# Altium footprint library General_Lib.PcbLib: 729 footprints (part 2 of 46)
Each footprint in its own frame and in the unit in brackets; x right, y up, seen from the top. Pads: shape width x height; smd on the part's side, far side on the other; paste and mask are expansions set on the pad; w line width, h text height; cw(c..) or ccw(c..) is an arc to the next point about the centre after c.
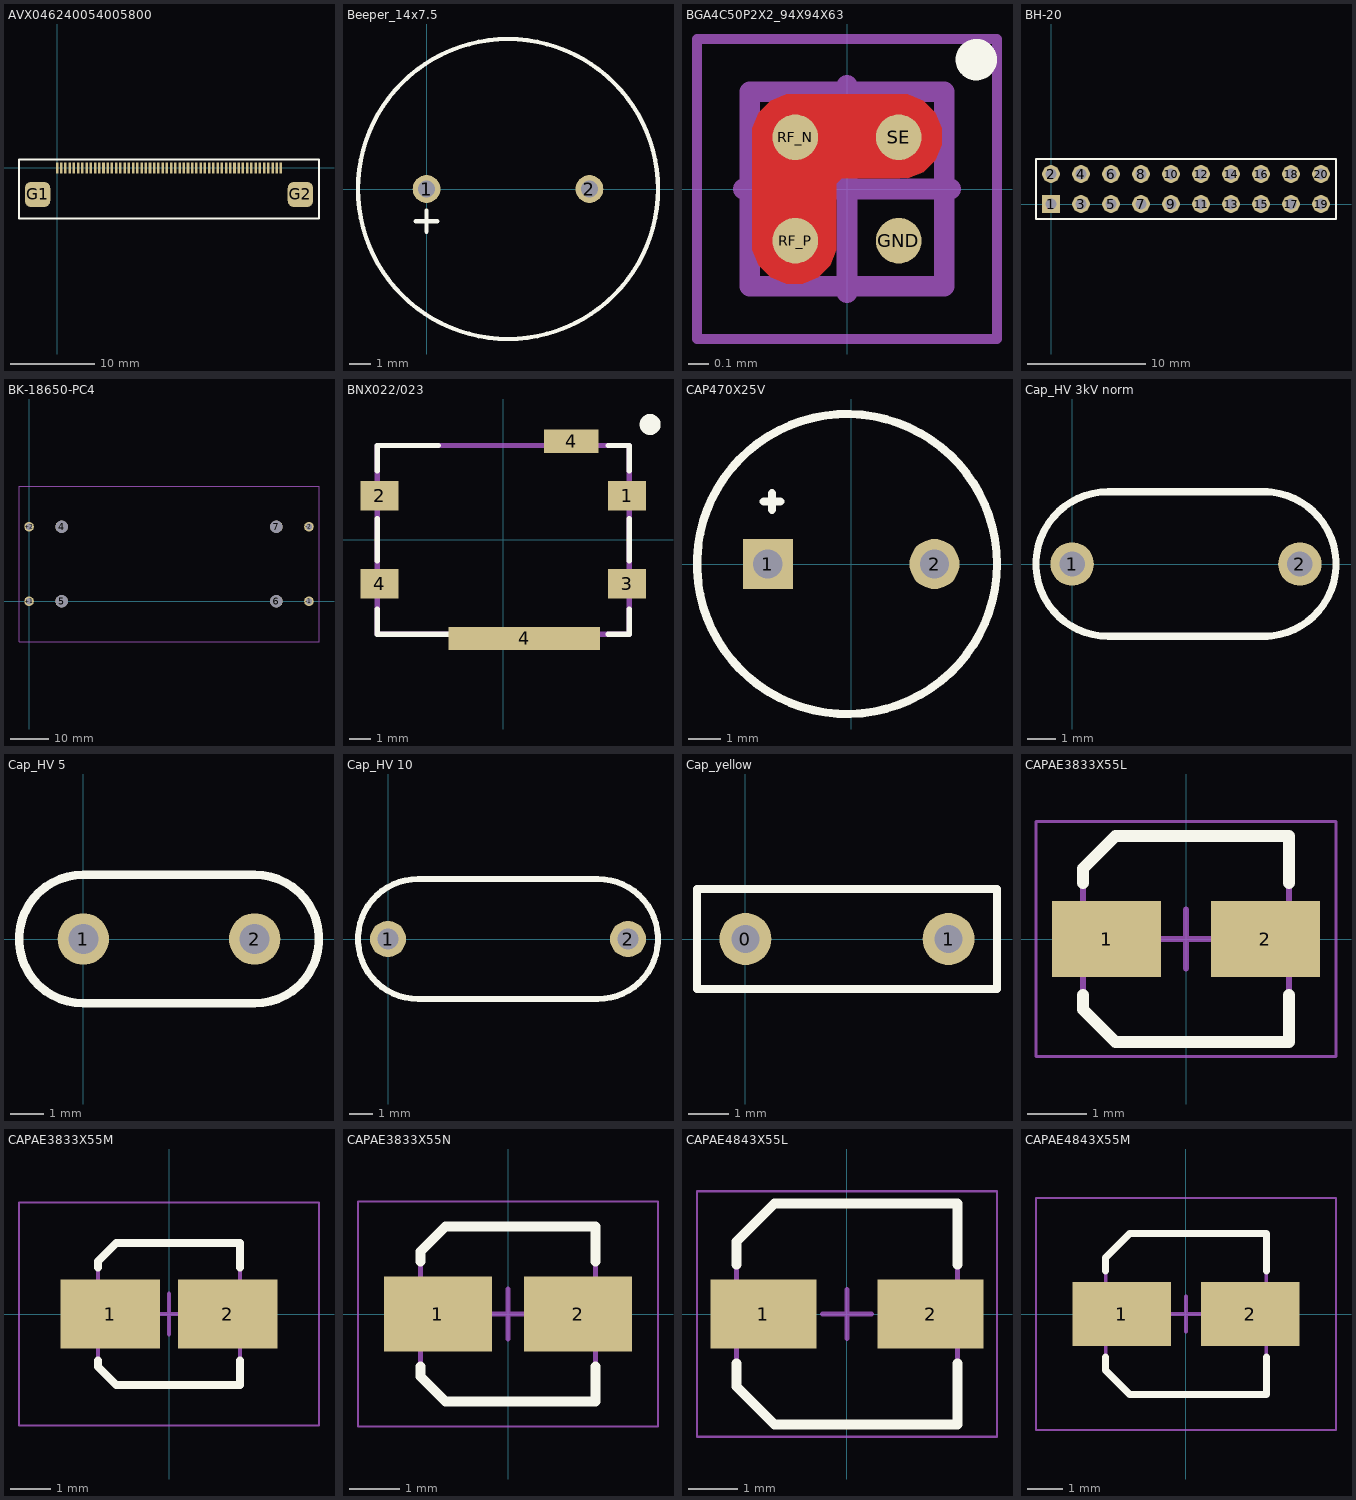
[diagram p1: the footprints below, top view; thin cyan lines are the x and y axes]

## AVX046240054005800 [mm] "0.5mm pitch 54 way connector fot TM035KBH11 TFT display"
height 2
pads (56):
  rect 0.3x1.3 smd: 1(0,0) 2(0.5,0) 3(1,0) 4(1.5,0) 5(2,0) 6(2.5,0) 7(3,0) 8(3.5,0) 9(4,0) 10(4.5,0) 11(5,0) 12(5.5,0) 13(6,0) 14(6.5,0) 15(7,0) 16(7.5,0) 17(8,0) 18(8.5,0) 19(9,0) 20(9.5,0) 21(10,0) 22(10.5,0) 23(11,0) 24(11.5,0) 25(12,0) 26(12.5,0) 27(13,0) 28(13.5,0) 29(14,0) 30(14.5,0) 31(15,0) 32(15.5,0) 33(16,0) 34(16.5,0) 35(17,0) 36(17.5,0) 37(18,0) 38(18.5,0) 39(19,0) 40(19.5,0) 41(20,0) 42(20.5,0) 43(21,0) 44(21.5,0) 45(22,0) 46(22.5,0) 47(23,0) 48(23.5,0) 49(24,0) 50(24.5,0) 51(25,0) 52(25.5,0) 53(26,0) 54(26.5,0)
  rrect50% 3x3 smd: G1(-2.3,-3.15) G2(28.8,-3.15)
Top Overlay:
  lines w0.2: -4.5,-6 -4.5,1 31,1 31,-6 -4.5,-6

## Beeper_14x7.5 [mm]
height 0.001
pads (2):
  round 1.3 hole 0.8: 1(0,0) 2(7.6,0)
Top Overlay:
  circle w0.2: c3.8,0 r7
  lines w0.2: -0.5,-1.5 0.5,-1.5 ; 0,-2 0,-1
3D body "HMP14A.step": height 7.59, standoff -5.5, extent -3.045,-6.845 10.645,6.845

## BGA4C50P2X2_94X94X63 [mm] "BGA, 4-Leads, Body 0.94x0.94mmx0.63mm, Pitch 0.50mm"
height 0.63
pads (4):
  round 0.22 smd mask+0.1: GND(0.25,-0.25) RF_N(-0.25,0.25) RF_P(-0.25,-0.25) SE(0.25,0.25)
Top Layer:
  pour cut-out: -0.254,-0.457 -0.294,-0.457 -0.369,-0.426 -0.426,-0.369 -0.457,-0.294 -0.457,-0.254 -0.457,0.254 -0.457,0.294 -0.426,0.369 -0.369,0.426 -0.294,0.457 -0.254,0.457 0.254,0.457 0.294,0.457 0.369,0.426 0.426,0.369 0.457,0.294 0.457,0.254 0.457,0.214 0.426,0.139 0.369,0.082 0.294,0.051 0.254,0.051 -0.025,0.051 -0.051,0.025 -0.051,-0.254 -0.051,-0.294 -0.082,-0.369 -0.139,-0.426 -0.214,-0.457
Top Overlay:
  circle w0.1: c0.625,0.625 r0.05
Mechanical 13:
  lines w0.1: -0.47,-0.47 0.47,-0.47 0.47,0.47 -0.47,0.47 -0.47,-0.47
Mechanical 15:
  lines w0.05: -0.725,-0.725 0.725,-0.725 0.725,0.725 -0.725,0.725 -0.725,-0.725
  lines w0.1: -0.5,0 0.5,0 ; 0,-0.5 0,0.5
3D body: height 0.63, standoff 0.3, extent -0.47,-0.47 0.47,0.47

## BH-20 [mm] "Connector; Header; 10x2 Position"
height 9
pads (20):
  rect 1.5x1.5 hole 0.9: 1(0,0)
  round 1.5 hole 0.9: 2(0,2.54) 3(2.54,0) 4(2.54,2.54) 5(5.08,0) 6(5.08,2.54) 7(7.62,0) 8(7.62,2.54) 9(10.16,0) 10(10.16,2.54) 11(12.7,0) 12(12.7,2.54) 13(15.24,0) 14(15.24,2.54) 15(17.78,0) 16(17.78,2.54) 17(20.32,0) 18(20.32,2.54) 19(22.86,0) 20(22.86,2.54)
Top Overlay:
  lines w0.2: -1.27,-1.27 0.635,-1.27 24.13,-1.27 24.13,3.81 0.635,3.81 -1.27,3.81 -1.27,-1.27
3D body "BH-20.step": height 8.75, standoff -3.1, extent -5.08,-3.105 27.94,5.995

## BK-18650-PC4 [mm]
pads (8):
  round 3.2 hole 3.2 unplated: 4(8.44,19.3) 5(8.44,0) 6(64.06,0) 7(64.06,19.3)
  round 2.5 hole 1.6: +1(0,0) +2(0,19.3) -1(72.5,0) -2(72.5,19.3)
Mechanical 15:
  lines w0.254: -2.6,-10.45 -2.6,29.75 75.1,29.75 75.1,-10.45 -2.6,-10.45
3D body "18650_holder.STEP": height 2.79, standoff -21.95, extent -2.6,-10.45 75.1,29.76

## BNX022/023 [mm]
pads (6):
  rect 1.8x1.4 smd: 1(5.9,2.1) 2(-5.9,2.1) 3(5.9,-2.1) 4(-5.9,-2.1)
  rect 7.2x1.1 smd: 4(1,-4.7)
  rect 2.6x1.1 smd: 4(3.25,4.7)
Top Overlay:
  circle w0.5: c7,5.5 r0.25
  lines w0.254: -6,-3.3 -6,-4.5 1.5,-4.5 ; -6,-1 -6,1 ; -6,3.3 -6,4.5 -3.1,4.5 ; 5,-4.5 6,-4.5 6,-3.3 ; 5,4.5 6,4.5 6,3.3 ; 6,-1 6,1
Mechanical 13:
  lines w0.254: -6,-4.5 6,-4.5 6,4.5 -6,4.5 -6,-4.5
3D body "User Library-BNX022.step": height 3.1, standoff 0, extent -6.05,-4.55 6.05,4.55

## CAP470X25V [mil]
height 472.44
pads (2):
  rect 60x60 hole 35: 1(-100,0)
  round 60 hole 35: 2(100,0)
Top Overlay:
  circle w10: c-5,0 r180
  lines w10: -105,75 -85,75 ; -95,65 -95,85
3D body "Cap electro 10x12_5x5_0mm.step": height 512.81, standoff -136.91, extent -197.85,-197.85 197.85,197.85

## Cap_HV 3kV norm [mil]
height 433.07
pads (2):
  round 60 hole 35: 1(0,0) 2(314.96,0)
Top Overlay:
  lines w10: 265,-100 ccw(c265,0) 265,100 ; 270,-100 50,-100 cw(c50,0) 50,100 270,100
3D body "CAP 8 HV.stp": height 472.3, standoff -59.06, extent -43.3,-60.04 358.28,58.07

## Cap_HV 5 [mil]
height 275.59
pads (2):
  round 60 hole 35: 1(0,0) 2(200,0)
Top Overlay:
  lines w10: 0,-75 cw(c0,0) 0,75 200,75 cw(c200,0) 200,-75 0,-75
3D body "Kondensator_5mm.step": height 452.76, standoff -42.01, extent -59.06,-49.61 255.91,49.21

## Cap_HV 10 [mil]
height 275.59
pads (2):
  round 60 hole 35: 1(0,0) 2(400,0)
Top Overlay:
  lines w10: 50,-100 cw(c50,0) 50,100 350,100 cw(c350,0) 350,-100 50,-100

## Cap_yellow [mm]
pads (2):
  round 1.3 hole 0.7: 0(0,0) 1(5.08,0)
Top Overlay:
  lines w0.2: -1.21,-1.25 6.29,-1.25 6.29,1.25 -1.21,1.25 -1.21,-1.25
3D body "Cap yellow.stp": height 6.5, standoff -3, extent -1.25,-1.25 6.25,1.25

## CAPAE3833X55L [mm] "Aluminum Electrolytic Capacitor, Body 3,30x3,30x5,50mm, IPC High Density"
height 5.5
pads (2):
  rect 1.85x1.3 smd: 1(-1.35,0) 2(1.35,0)
Top Overlay:
  lines w0.2: -1.75,-0.95 -1.75,-1.2 -1.2,-1.75 1.75,-1.75 1.75,-0.95 ; -1.75,0.95 -1.75,1.2 -1.2,1.75 1.75,1.75 1.75,0.95
Mechanical 13:
  lines w0.1: -1.75,-1.2 -1.75,1.2 -1.2,1.75 1.75,1.75 1.75,-1.75 -1.2,-1.75 -1.75,-1.2
Mechanical 15:
  lines w0.05: -2.55,-2 2.55,-2 2.55,2 -2.55,2 -2.55,-2
  lines w0.1: -0.5,0 0.5,0 ; 0,-0.5 0,0.5
3D body "CAPAE3833X55L.step": height 5.5, standoff 0, extent -1.875,-1.75 1.875,1.75

## CAPAE3833X55M [mm] "Aluminum Electrolytic Capacitor, Body 3,30x3,30x5,50mm, IPC Low Density"
height 5.5
pads (2):
  rect 2.45x1.7 smd: 1(-1.45,0) 2(1.45,0)
Top Overlay:
  lines w0.2: -1.75,-1.15 -1.75,-1.3 -1.3,-1.75 1.75,-1.75 1.75,-1.15 ; -1.75,1.15 -1.75,1.3 -1.3,1.75 1.75,1.75 1.75,1.15
Mechanical 13:
  lines w0.1: -1.75,-1.3 -1.3,-1.75 1.75,-1.75 1.75,1.75 -1.3,1.75 -1.75,1.3 -1.75,-1.3
Mechanical 15:
  lines w0.05: -3.7,-2.75 -3.7,2.75 3.7,2.75 3.7,-2.75 -3.7,-2.75
  lines w0.1: -0.5,0 0.5,0 ; 0,-0.5 0,0.5
3D body "CAPAE3833X55M.step": height 5.5, standoff 0, extent -1.875,-1.75 1.875,1.75

## CAPAE3833X55N [mm] "Aluminum Electrolytic Capacitor, Body 3,30x3,30x5,50mm, IPC Medium Density"
height 5.5
pads (2):
  rect 2.15x1.5 smd: 1(-1.4,0) 2(1.4,0)
Top Overlay:
  lines w0.2: -1.75,-1.05 -1.75,-1.25 -1.25,-1.75 1.75,-1.75 1.75,-1.05 ; -1.75,1.05 -1.75,1.25 -1.25,1.75 1.75,1.75 1.75,1.05
Mechanical 13:
  lines w0.1: -1.75,-1.25 -1.75,1.25 -1.25,1.75 1.75,1.75 1.75,-1.75 -1.25,-1.75 -1.75,-1.25
Mechanical 15:
  lines w0.05: -3,-2.25 3,-2.25 3,2.25 -3,2.25 -3,-2.25
  lines w0.1: -0.5,0 0.5,0 ; 0,-0.5 0,0.5
3D body "CAPAE3833X55N.step": height 5.5, standoff 0, extent -1.875,-1.75 1.875,1.75

## CAPAE4843X55L [mm] "Aluminum Electrolytic Capacitor, Body 4,30x4,30x5,50mm, IPC High Density"
height 5.5
pads (2):
  rect 2.15x1.4 smd: 1(-1.7,0) 2(1.7,0)
Top Overlay:
  lines w0.2: -2.25,-1 -2.25,-1.475 -1.475,-2.25 2.25,-2.25 2.25,-1 ; -2.25,1 -2.25,1.475 -1.475,2.25 2.25,2.25 2.25,1
Mechanical 13:
  lines w0.1: -2.25,-1.475 -2.25,1.475 -1.475,2.25 2.25,2.25 2.25,-2.25 -1.475,-2.25 -2.25,-1.475
Mechanical 15:
  lines w0.05: -3.05,-2.5 3.05,-2.5 3.05,2.5 -3.05,2.5 -3.05,-2.5
  lines w0.1: -0.5,0 0.5,0 ; 0,-0.5 0,0.5
3D body "CAPAE4843X55L.step": height 5.5, standoff 0, extent -2.375,-2.25 2.375,2.25

## CAPAE4843X55M [mm] "Aluminum Electrolytic Capacitor, Body 4,30x4,30x5,50mm, IPC Low Density"
height 5.5
pads (2):
  rect 2.75x1.8 smd: 1(-1.8,0) 2(1.8,0)
Top Overlay:
  lines w0.2: -2.25,-1.2 -2.25,-1.575 -1.575,-2.25 2.25,-2.25 2.25,-1.2 ; -2.25,1.2 -2.25,1.575 -1.575,2.25 2.25,2.25 2.25,1.2
Mechanical 13:
  lines w0.1: -2.25,-1.575 -1.575,-2.25 2.25,-2.25 2.25,2.25 -1.575,2.25 -2.25,1.575 -2.25,-1.575
Mechanical 15:
  lines w0.05: -4.2,-3.25 -4.2,3.25 4.2,3.25 4.2,-3.25 -4.2,-3.25
  lines w0.1: -0.5,0 0.5,0 ; 0,-0.5 0,0.5
3D body "CAPAE4843X55M.step": height 5.5, standoff 0, extent -2.375,-2.25 2.375,2.25